# Altium footprint library hdmi_lvds.PcbLib: 60 footprints (part 1 of 4)
Each footprint in its own frame and in the unit in brackets; x right, y up, seen from the top. Pads: shape width x height; smd on the part's side, far side on the other; paste and mask are expansions set on the pad; w line width, h text height; cw(c..) or ccw(c..) is an arc to the next point about the centre after c.
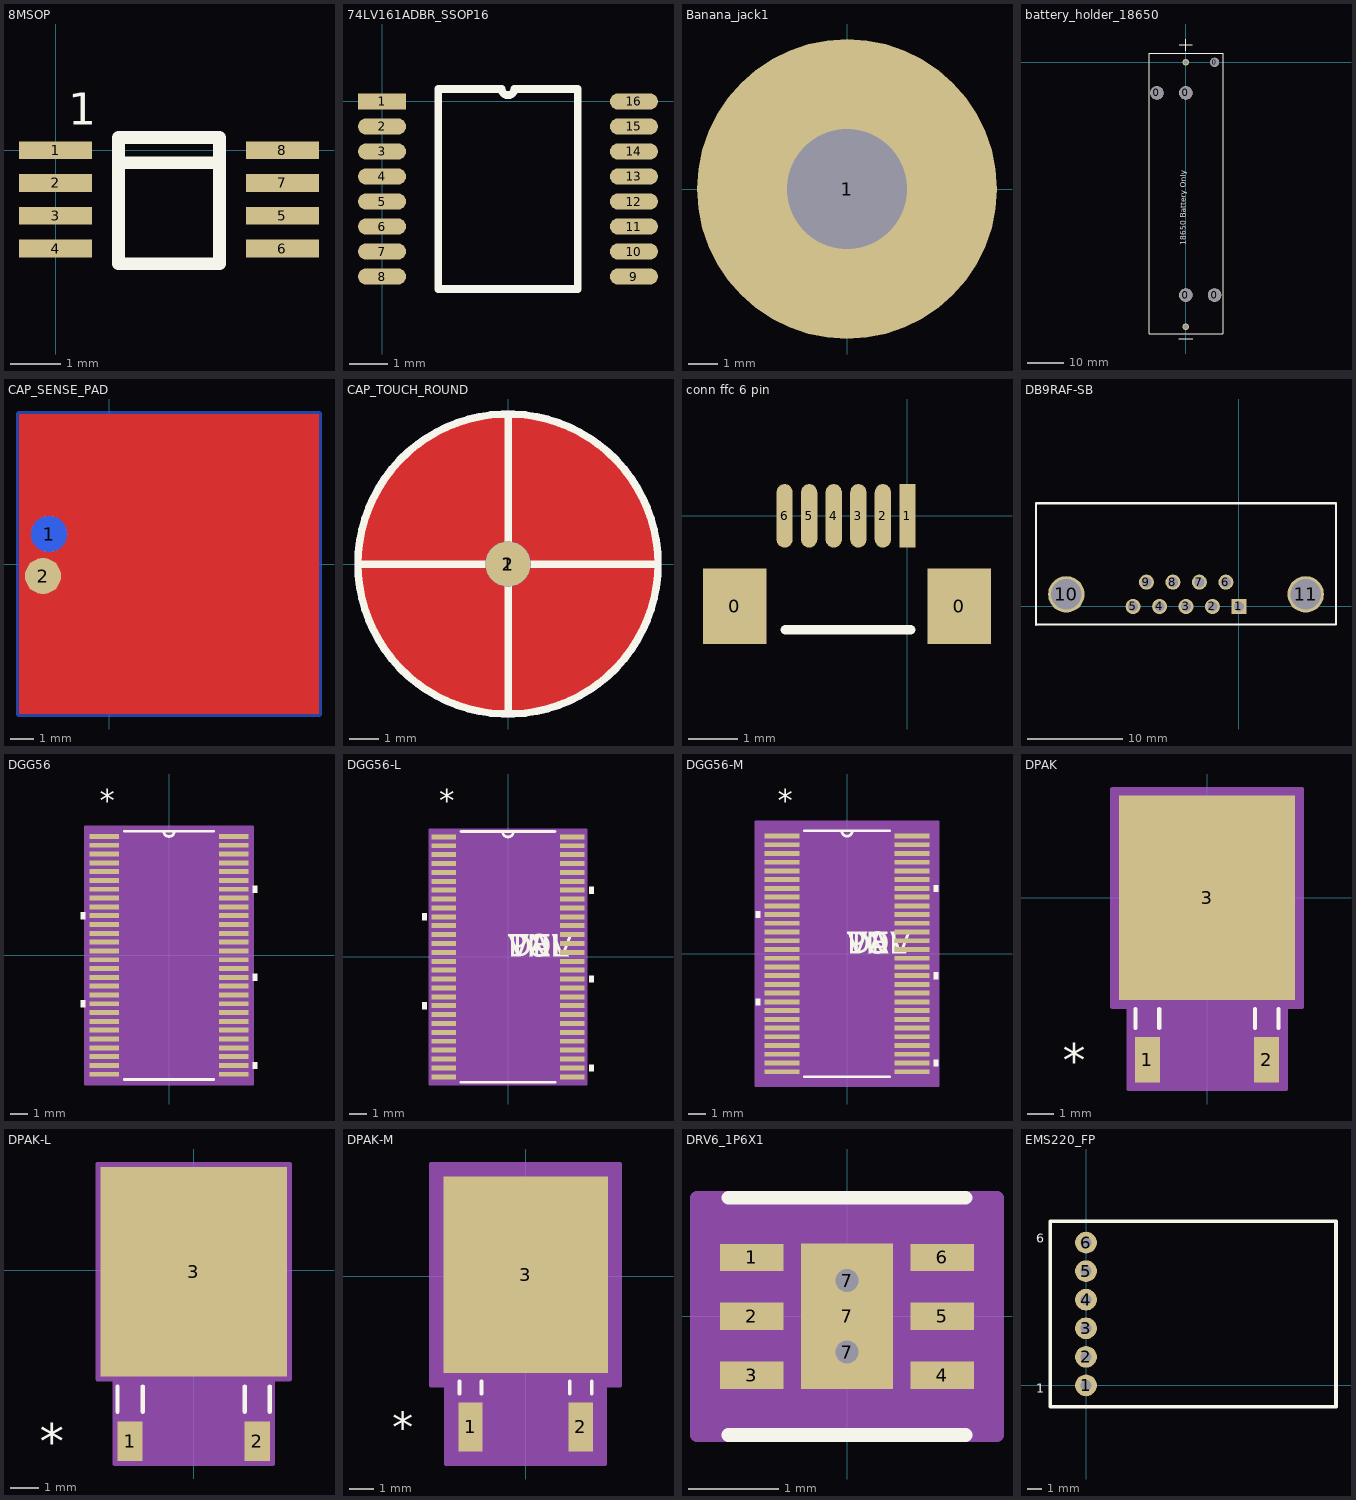
[diagram p0: the footprints below, top view; thin cyan lines are the x and y axes]

## 8MSOP [mm] "8MSOP"
height 0.025
pads (8):
  rect 1.448x0.35 smd: 1(0,0) 2(0,-0.65) 3(0,-1.3) 4(0,-1.95) 5(4.5,-1.3) 6(4.5,-1.95) 7(4.5,-0.65) 8(4.5,0)
Top Overlay:
  lines w0.254: 1.25,-0.25 3.25,-0.25 ; 1.25,-2.25 3.25,-2.25 3.25,0.25 1.25,0.25 1.25,-2.25
  text "1" at 0.25,0.5 h0.64

## 74LV161ADBR_SSOP16 [mm]
height 2
pads (16):
  rect 1.25x0.42 smd: 1(0,0)
  oval 1.25x0.42 smd: 2(0,-0.65) 3(0,-1.3) 4(0,-1.95) 5(0,-2.6) 6(0,-3.25) 7(0,-3.9) 8(0,-4.55) 9(6.55,-4.55) 10(6.55,-3.9) 11(6.55,-3.25) 12(6.55,-2.6) 13(6.55,-1.95) 14(6.55,-1.3) 15(6.55,-0.65) 16(6.55,0)
Top Overlay:
  lines w0.2: 1.46,-4.875 1.46,0.325 3.113,0.325 ccw(c3.275,0.325) 3.437,0.325 5.09,0.325 5.09,-4.875 1.46,-4.875

## Banana_jack1 [mil]
pads (1):
  round 400 hole 160: 1(0,0)

## battery_holder_18650 [mm]
height 15
pads (7):
  round 3.7 hole 3.55: 0(-7.87,-8.38) 0(0,-63.58) 0(0,-8.38) 0(7.87,-63.58)
  round 2.5 hole 2.39: 0(7.87,0)
  round 1.8 hole 1.32: 1(0,0) 2(0,-72.22)
Top Overlay:
  lines w0.254: -1.905,-75.565 1.905,-75.565 ; -1.778,4.826 1.778,4.826 ; 0,3.175 0,6.35 ; 9.97,2.413 -9.906,2.413 -9.906,-74.168 10.033,-74.168 10.033,2.413
  text "18650 Battery Only" at 0,-49.911 h1.52

## CAP_SENSE_PAD [mil] "CAP_SENSE_PAD"
height 1
pads (2):
  round 60 smd far side: 1(-100,50)
  round 60 smd: 2(-110,-20)
Top Layer:
  rectangle: -150,-250 350,250
Bottom Layer:
  lines w10: -150,-200 350,-200 ; -150,-150 350,-150 ; -150,-100 350,-100 ; -150,-50 350,-50 ; -150,0 350,0 ; -150,50 350,50 ; -150,100 350,100 ; -150,150 350,150 ; -150,200 350,200 ; -100,-250 -100,250 ; -50,-250 -50,250 ; 0,-250 0,250 ; 50,-250 50,250 ; 100,-250 100,250 ; 150,-250 150,250 ; 200,-250 200,250 ; 250,-250 250,250 ; 300,-250 300,250 ; -150,-250 -150,250 350,250 350,-250 -150,-250

## CAP_TOUCH_ROUND [mil] "CAP_TOUCH_ROUND"
height 1
pads (2):
  round 60 smd: 1(0,0)
  round 60 smd far side: 2(0,0)
Top Layer:
  circle w200: c0,0 r100
  lines w10: 0,-200 0,200 ; 170,0 200,0 180,0
Bottom Layer:
  circle w10: c0,0 r200
  lines w10: -200,0 200,0 ; -190,-50 190,-50 ; -190,50 190,50 ; -170,-100 170,-100 ; -170,100 170,100 ; -150,-130 -150,130 ; -130,-150 130,-150 ; -130,150 130,150 ; -100,-170 -100,170 ; -50,-190 -50,190 ; 0,-200 0,200 ; 50,-190 50,190 ; 100,-170 100,170 ; 150,-130 150,130
Top Overlay:
  circle w10: c0,0 r200
  lines w10: -200,0 200,0 ; 0,-200 0,200

## conn ffc 6 pin [mm]
height 1.2
pads (8):
  rect 1.286x1.537 smd: 0(-3.516,-1.841) 0(1.056,-1.841)
  rect 0.33x1.295 smd: 1(0,0)
  oval 0.33x1.295 smd: 2(-0.5,0) 3(-1,0) 4(-1.5,0) 5(-2,0) 6(-2.5,0)
Top Overlay:
  lines w0.2: -2.48,-2.321 0.06,-2.321

## DB9RAF-SB [mil] "DB-9 Right Angle, Short Body"
height 500
pads (11):
  rect 62x62 hole 42: 1(0,0)
  round 62 hole 42: 2(-109,0) 3(-218,0) 4(-327,0) 5(-436,0) 6(-54,100) 7(-163,100) 8(-272,100) 9(-381,100)
  round 150 hole 125: 10(-711,50) 11(275,50)
Top Overlay:
  lines w8: -836,-75 400,-75 400,425
  lines w10: -836,-75 -836,425 400,425

## DGG56 [mil]
pads (56):
  rect 66x11 smd: 1(-144.5,265.75) 2(-144.5,246.06) 3(-144.5,226.38) 4(-144.5,206.69) 5(-144.5,187.01) 6(-144.5,167.32) 7(-144.5,147.64) 8(-144.5,127.95) 9(-144.5,108.27) 10(-144.5,88.58) 11(-144.5,68.9) 12(-144.5,49.21) 13(-144.5,29.53) 14(-144.5,9.84) 15(-144.5,-9.84) 16(-144.5,-29.53) 17(-144.5,-49.21) 18(-144.5,-68.9) 19(-144.5,-88.58) 20(-144.5,-108.27) 21(-144.5,-127.95) 22(-144.5,-147.64) 23(-144.5,-167.32) 24(-144.5,-187.01) 25(-144.5,-206.69) 26(-144.5,-226.38) 27(-144.5,-246.06) 28(-144.5,-265.75) 29(144.5,-265.75) 30(144.5,-246.06) 31(144.5,-226.38) 32(144.5,-206.69) 33(144.5,-187.01) 34(144.5,-167.32) 35(144.5,-147.64) 36(144.5,-127.95) 37(144.5,-108.27) 38(144.5,-88.58) 39(144.5,-68.9) 40(144.5,-49.21) 41(144.5,-29.53) 42(144.5,-9.84) 43(144.5,9.84) 44(144.5,29.53) 45(144.5,49.21) 46(144.5,68.9) 47(144.5,88.58) 48(144.5,108.27) 49(144.5,127.95) 50(144.5,147.64) 51(144.5,167.32) 52(144.5,187.01) 53(144.5,206.69) 54(144.5,226.38) 55(144.5,246.06) 56(144.5,265.75)
Top Overlay:
  region: -187.5,96.08 -197.5,96.08 -197.5,81.08 -187.5,81.08
  region: -187.5,-100.77 -197.5,-100.77 -197.5,-115.77 -187.5,-115.77
  region: 187.5,-238.56 197.5,-238.56 197.5,-253.56 187.5,-253.56
  region: 187.5,-41.71 197.5,-41.71 197.5,-56.71 187.5,-56.71
  region: 187.5,155.14 197.5,155.14 197.5,140.14 187.5,140.14
  lines w6: -99.99,-277.5 99.99,-277.5 ; -99.99,277.5 99.99,277.5 ; -12,277.5 ccw(c0,277.5) 12,277.5
  text "*" at -154.5,321.75 h50
Mechanical 13:
  lines w0: -12,277.5 ccw(c0,277.5) 12,277.5
  text "*" at -154.5,321.75 h50
Mechanical 15:
  region: 187.5,-287.5 -187.5,-287.5 -187.5,287.5 187.5,287.5
  lines w6: -187.5,-287.5 -187.5,287.5 187.5,287.5 187.5,-287.5 -187.5,-287.5
3D body "DGG56.stp": height 47.1, standoff 0, extent -163.5,-277.5 163.5,277.5

## DGG56-L [mil]
pads (56):
  rect 54x11 smd: 1(-142.5,265.75) 2(-142.5,246.06) 3(-142.5,226.38) 4(-142.5,206.69) 5(-142.5,187.01) 6(-142.5,167.32) 7(-142.5,147.64) 8(-142.5,127.95) 9(-142.5,108.27) 10(-142.5,88.58) 11(-142.5,68.9) 12(-142.5,49.21) 13(-142.5,29.53) 14(-142.5,9.84) 15(-142.5,-9.84) 16(-142.5,-29.53) 17(-142.5,-49.21) 18(-142.5,-68.9) 19(-142.5,-88.58) 20(-142.5,-108.27) 21(-142.5,-127.95) 22(-142.5,-147.64) 23(-142.5,-167.32) 24(-142.5,-187.01) 25(-142.5,-206.69) 26(-142.5,-226.38) 27(-142.5,-246.06) 28(-142.5,-265.75) 29(142.5,-265.75) 30(142.5,-246.06) 31(142.5,-226.38) 32(142.5,-206.69) 33(142.5,-187.01) 34(142.5,-167.32) 35(142.5,-147.64) 36(142.5,-127.95) 37(142.5,-108.27) 38(142.5,-88.58) 39(142.5,-68.9) 40(142.5,-49.21) 41(142.5,-29.53) 42(142.5,-9.84) 43(142.5,9.84) 44(142.5,29.53) 45(142.5,49.21) 46(142.5,68.9) 47(142.5,88.58) 48(142.5,108.27) 49(142.5,127.95) 50(142.5,147.64) 51(142.5,167.32) 52(142.5,187.01) 53(142.5,206.69) 54(142.5,226.38) 55(142.5,246.06) 56(142.5,265.75)
Top Overlay:
  region: 179.5,155.14 189.5,155.14 189.5,140.14 179.5,140.14
  region: 179.5,-41.71 189.5,-41.71 189.5,-56.71 179.5,-56.71
  region: 179.5,-238.56 189.5,-238.56 189.5,-253.56 179.5,-253.56
  region: -179.5,-100.77 -189.5,-100.77 -189.5,-115.77 -179.5,-115.77
  region: -179.5,96.08 -189.5,96.08 -189.5,81.08 -179.5,81.08
  lines w6: -103.99,-277.5 103.99,-277.5 ; -103.99,277.5 103.99,277.5 ; -12,277.5 ccw(c0,277.5) 12,277.5
  text "TOL" at 0,0 h50
  text "VAL" at 0,0 h50
  text "DEV" at 0,0 h50
  text "PN" at 0,0 h50
  text "*" at -152.5,321.75 h50
Mechanical 13:
  lines w0: -12,277.5 ccw(c0,277.5) 12,277.5
  text "RefDes2" at 0,0 h50
  text "*" at -152.5,321.75 h50
Mechanical 15:
  region: 173.5,-281.5 -173.5,-281.5 -173.5,281.5 173.5,281.5
  lines w6: -173.5,-281.5 173.5,-281.5 173.5,281.5 -173.5,281.5 -173.5,-281.5
3D body "DGG56-L.stp": height 47.1, standoff 0, extent -163.5,-277.5 163.5,277.5

## DGG56-M [mil]
pads (56):
  rect 78x11 smd: 1(-146.5,265.75) 2(-146.5,246.06) 3(-146.5,226.38) 4(-146.5,206.69) 5(-146.5,187.01) 6(-146.5,167.32) 7(-146.5,147.64) 8(-146.5,127.95) 9(-146.5,108.27) 10(-146.5,88.58) 11(-146.5,68.9) 12(-146.5,49.21) 13(-146.5,29.53) 14(-146.5,9.84) 15(-146.5,-9.84) 16(-146.5,-29.53) 17(-146.5,-49.21) 18(-146.5,-68.9) 19(-146.5,-88.58) 20(-146.5,-108.27) 21(-146.5,-127.95) 22(-146.5,-147.64) 23(-146.5,-167.32) 24(-146.5,-187.01) 25(-146.5,-206.69) 26(-146.5,-226.38) 27(-146.5,-246.06) 28(-146.5,-265.75) 29(146.5,-265.75) 30(146.5,-246.06) 31(146.5,-226.38) 32(146.5,-206.69) 33(146.5,-187.01) 34(146.5,-167.32) 35(146.5,-147.64) 36(146.5,-127.95) 37(146.5,-108.27) 38(146.5,-88.58) 39(146.5,-68.9) 40(146.5,-49.21) 41(146.5,-29.53) 42(146.5,-9.84) 43(146.5,9.84) 44(146.5,29.53) 45(146.5,49.21) 46(146.5,68.9) 47(146.5,88.58) 48(146.5,108.27) 49(146.5,127.95) 50(146.5,147.64) 51(146.5,167.32) 52(146.5,187.01) 53(146.5,206.69) 54(146.5,226.38) 55(146.5,246.06) 56(146.5,265.75)
Top Overlay:
  region: 195.5,155.14 205.5,155.14 205.5,140.14 195.5,140.14
  region: 195.5,-41.71 205.5,-41.71 205.5,-56.71 195.5,-56.71
  region: 195.5,-238.56 205.5,-238.56 205.5,-253.56 195.5,-253.56
  region: -195.5,-100.77 -205.5,-100.77 -205.5,-115.77 -195.5,-115.77
  region: -195.5,96.08 -205.5,96.08 -205.5,81.08 -195.5,81.08
  lines w6: -95.99,-277.5 95.99,-277.5 ; -95.99,277.5 95.99,277.5 ; -12,277.5 ccw(c0,277.5) 12,277.5
  text "TOL" at 0,0 h50
  text "VAL" at 0,0 h50
  text "DEV" at 0,0 h50
  text "PN" at 0,0 h50
  text "*" at -156.5,321.75 h50
Mechanical 13:
  lines w0: -12,277.5 ccw(c0,277.5) 12,277.5
  text "RefDes2" at 0,0 h50
  text "*" at -156.5,321.75 h50
Mechanical 15:
  region: 205.5,-297.5 -205.5,-297.5 -205.5,297.5 205.5,297.5
  lines w6: -205.5,-297.5 205.5,-297.5 205.5,297.5 -205.5,297.5 -205.5,-297.5
3D body "DGG56-M.stp": height 47.1, standoff 0, extent -163.5,-277.5 163.5,277.5

## DPAK [mil]
height 100
pads (3):
  rect 37x67 smd paste+0 mask+0: 1(-88.58,-240.5) 2(88.58,-240.5)
  rect 262x304 smd paste+0 mask+0: 3(0,0)
Top Overlay:
  lines w6: -106.08,-193 -106.08,-165.1 ; -71.08,-193 -71.08,-165.1 ; 71.08,-193 71.08,-165.1 ; 106.08,-193 106.08,-165.1
  text "*" at -214.67,-265.5 h50
Mechanical 13:
  lines w1: -130,-138 -130,138 130,138 130,-138 -130,-138 ; -106.08,-260 -71.08,-260 -71.08,-138 -106.08,-138 -106.08,-260 ; 71.08,-260 106.08,-260 106.08,-138 71.08,-138 71.08,-260
  text "*" at -101.08,-153 h50
Mechanical 15:
  region: -117.08,-162 -141,-162 -141,162 141,162 141,-162 117.08,-162 117.08,-284 -117.08,-284
  lines w6: -141,-162 -117.08,-162 -117.08,-284 117.08,-284 117.08,-162 141,-162 141,162 -141,162 -141,-162
3D body: height 10, standoff 0, extent 0,0 10,10

## DPAK-L [mil]
pads (3):
  rect 35x55 smd paste+0 mask+0: 1(-88.58,-238.5) 2(88.58,-238.5)
  rect 260x292 smd paste+0 mask+0: 3(0,-2)
Top Overlay:
  lines w6: -106.08,-197 -106.08,-162 ; -71.08,-197 -71.08,-162 ; 71.08,-197 71.08,-162 ; 106.08,-197 106.08,-162
  text "*" at -214.67,-263.5 h50
Mechanical 13:
  lines w1: -130,-138 -130,138 130,138 130,-138 -130,-138 ; -106.08,-260 -71.08,-260 -71.08,-138 -106.08,-138 -106.08,-260 ; 71.08,-260 106.08,-260 106.08,-138 71.08,-138 71.08,-260
  text "*" at -101.08,-153 h50
Mechanical 15:
  region: -110.08,-152 -134,-152 -134,148 134,148 134,-152 110.08,-152 110.08,-270 -110.08,-270
  lines w6: -134,-152 -110.08,-152 -110.08,-270 110.08,-270 110.08,-152 134,-152 134,148 -134,148 -134,-152
3D body: height 10, standoff 0, extent 0,0 10,10

## DPAK-M [mil]
pads (3):
  rect 39x79 smd paste+0 mask+0: 1(-88.58,-242.5) 2(88.58,-242.5)
  rect 264x316 smd paste+0 mask+0: 3(0,2)
Top Overlay:
  lines w6: -106.08,-189 -106.08,-169.1 ; -71.08,-189 -71.08,-169.1 ; 71.08,-189 71.08,-169.1 ; 106.08,-189 106.08,-169.1
  text "*" at -214.67,-267.5 h50
Mechanical 13:
  lines w1: -130,-138 130,-138 130,138 -130,138 -130,-138 ; -106.08,-260 -106.08,-138 -71.08,-138 -71.08,-260 -106.08,-260 ; 71.08,-260 71.08,-138 106.08,-138 106.08,-260 71.08,-260
  text "*" at -101.08,-153 h50
Mechanical 15:
  region: -128.08,-176 -152,-176 -152,180 152,180 152,-176 128.08,-176 128.08,-302 -128.08,-302
  lines w6: -152,-176 -152,180 152,180 152,-176 128.08,-176 128.08,-302 -128.08,-302 -128.08,-176 -152,-176
3D body: height 10, standoff 0, extent 0,0 10,10

## DRV6_1P6X1 [mm]
pads (9):
  rect 0.7x0.3 smd paste-0.15: 1(-1.05,0.65) 2(-1.05,0) 3(-1.05,-0.65) 4(1.05,-0.65) 5(1.05,0) 6(1.05,0.65)
  round 0.508 / inner round 1.524 / far side round 0.508 hole 0.254: 7(0,-0.394) 7(0,0.394)
  rect 1.016x1.6 smd paste-0.787 mask-0.787: 7(0,0)
Top Layer:
  region: 0,-0.8
  region: 0,0.8
Top Overlay:
  lines w0.152: -1.308,-1.308 1.308,-1.308 ; -1.308,1.308 1.308,1.308
Top Paste:
  region: 0.433,-0.494 0.241,-0.494 0.1,-0.635 0.1,-0.725 0.433,-0.725
  region: 0.433,0.294 0.241,0.294 0.1,0.152 0.1,-0.152 0.241,-0.294 0.433,-0.294
  region: 0.433,0.725 0.1,0.725 0.1,0.635 0.241,0.494 0.433,0.494
  region: -0.241,-0.494 -0.433,-0.494 -0.433,-0.725 -0.1,-0.725 -0.1,-0.635
  region: -0.241,0.294 -0.433,0.294 -0.433,-0.294 -0.241,-0.294 -0.1,-0.152 -0.1,0.152
  region: -0.1,0.725 -0.433,0.725 -0.433,0.494 -0.241,0.494 -0.1,0.635
  region: 1.375,0.775 0.725,0.775 0.725,0.525 1.375,0.525
  region: 1.375,0.125 0.725,0.125 0.725,-0.125 1.375,-0.125
  region: 1.375,-0.525 0.725,-0.525 0.725,-0.775 1.375,-0.775
  region: -0.725,-0.525 -1.375,-0.525 -1.375,-0.775 -0.725,-0.775
  region: -0.725,0.125 -1.375,0.125 -1.375,-0.125 -0.725,-0.125
  region: -0.725,0.775 -1.375,0.775 -1.375,0.525 -0.725,0.525
Top Solder:
  region: 0,-0.8
  region: 0,0.8
  region: 0.2,-0.864 0.2,0.864 0.572,0.864 0.572,-0.864
  region: -0.572,-0.864 -0.572,0.864 -0.2,0.864 -0.2,-0.864
  region: -0.572,-0.864 -0.572,-0.594 0.572,-0.594 0.572,-0.864
  region: -0.572,-0.194 -0.572,0.194 0.572,0.194 0.572,-0.194
  region: -0.572,0.594 -0.572,0.864 0.572,0.864 0.572,0.594
  region: 1.47,0.87 0.63,0.87 0.63,0.43 1.47,0.43
  region: 1.47,0.22 0.63,0.22 0.63,-0.22 1.47,-0.22
  region: 1.47,-0.43 0.63,-0.43 0.63,-0.87 1.47,-0.87
  region: -0.63,-0.43 -1.47,-0.43 -1.47,-0.87 -0.63,-0.87
  region: -0.63,0.22 -1.47,0.22 -1.47,-0.22 -0.63,-0.22
  region: -0.63,0.87 -1.47,0.87 -1.47,0.43 -0.63,0.43
Mechanical 13:
  lines w0: -0.305,1.054 ccw(c0,1.054) 0.305,1.054
Mechanical 15:
  region: 1.654,-1.308 -1.654,-1.308 -1.654,1.308 1.654,1.308
  lines w0.152: -1.654,-1.308 1.654,-1.308 1.654,1.308 -1.654,1.308 -1.654,-1.308
3D body "DRV6_1P6X1.stp": height 0.82, standoff 0, extent -1.105,-1.054 1.105,1.054

## EMS220_FP [mil] "EMS220 rot encoder FP"
height 500
pads (6):
  round 60 hole 30 unplated: 1(0,0) 2(0,78.74) 3(0,157.48) 5(0,314.96) 6(0,393.7)
  round 60 hole 30: 4(0,236.22)
Top Overlay:
  lines w10: -98.43,-59.06 -98.43,452.76 688.98,452.76 688.98,-59.06 -98.43,-59.06
  text "1" at -137.8,-19.68 h25
  text "6" at -137.8,393.7 h25